# Altium integrated library OneBox.IntLib: 172 symbols (part 2 of 2) (continued)
## RK809 (continued)
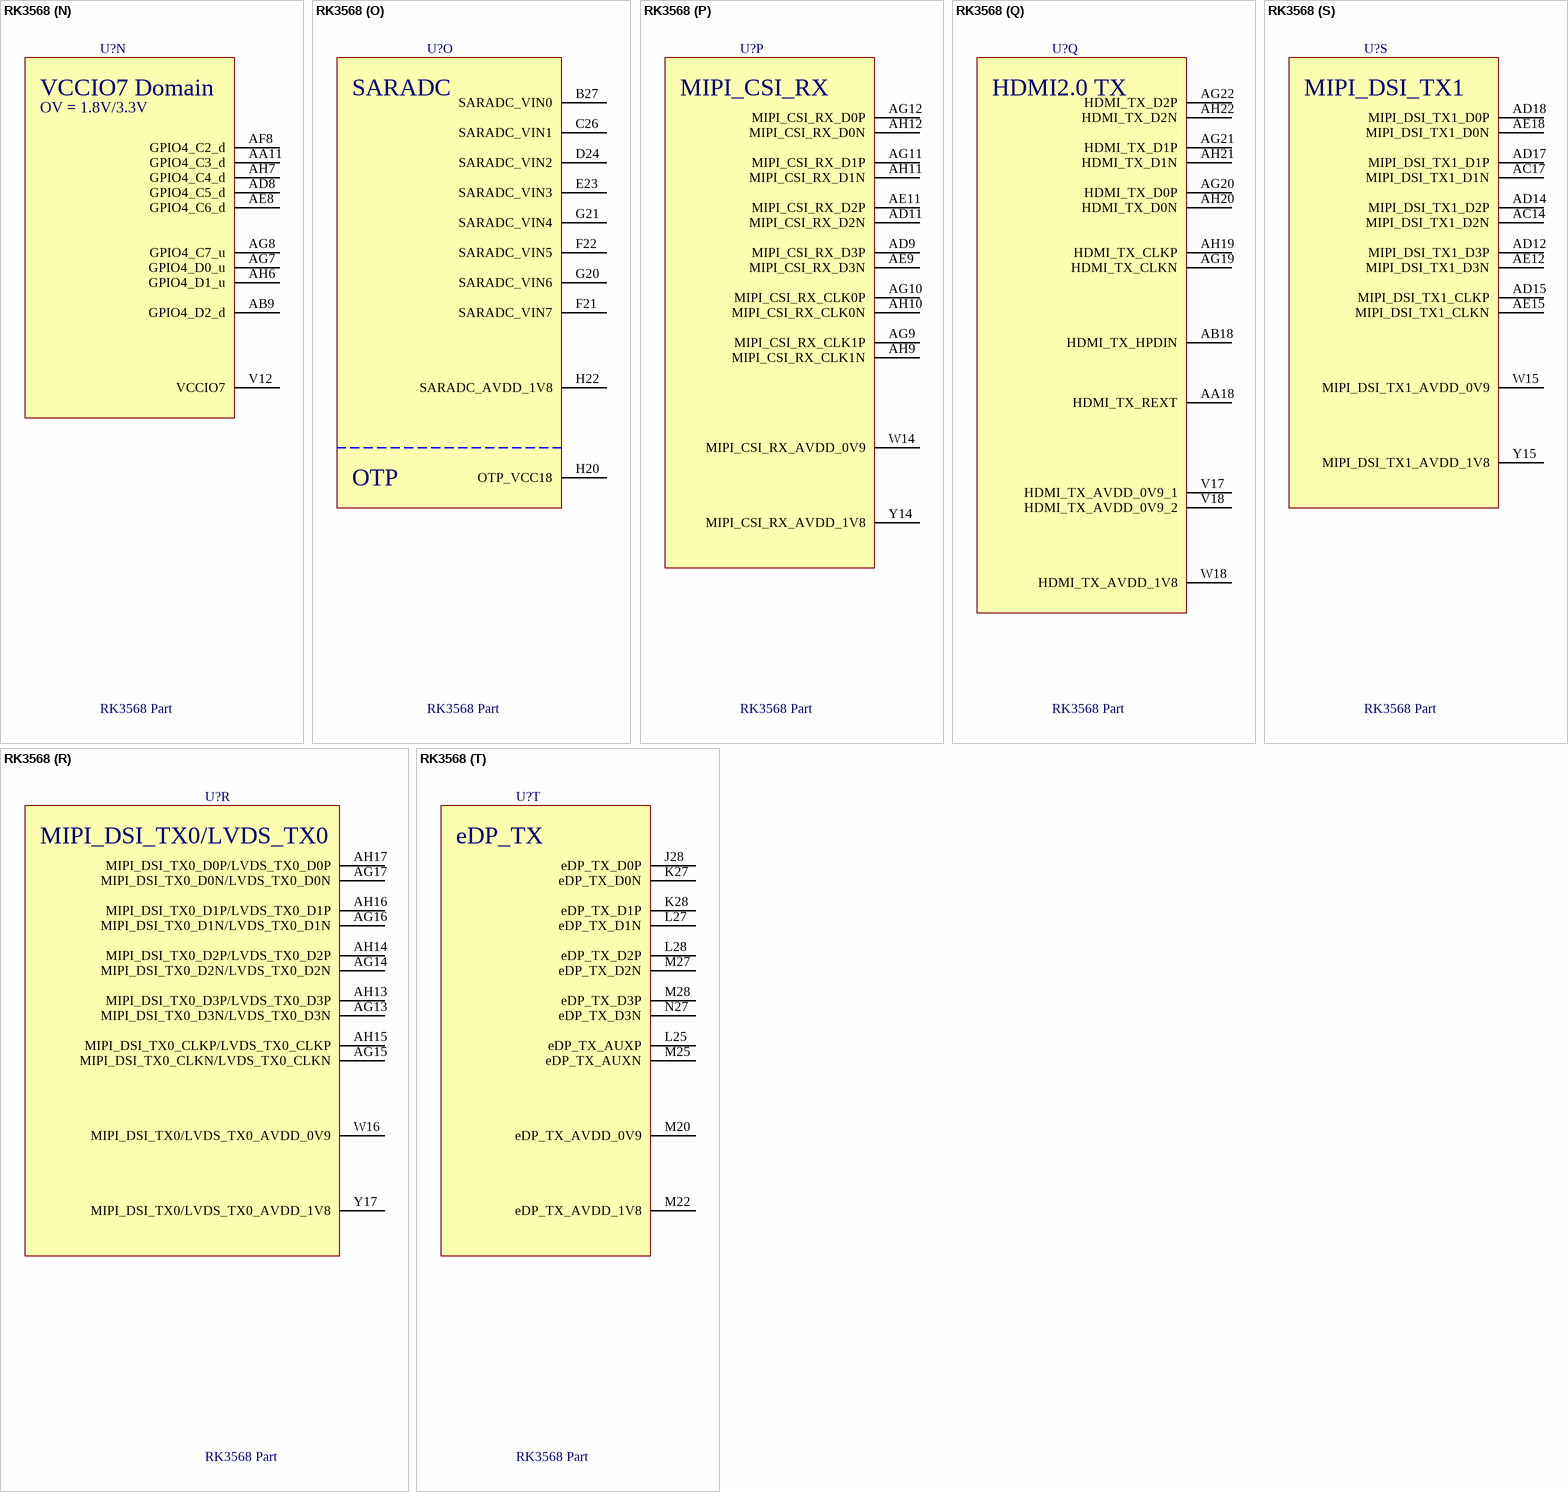
[diagram p7: symbol RK3568]
part A text: BUCK1; BUCK4; 2.5A; 1.5A; 0.5-2.4V; 0.5-3.4V; BUCK2; BUCK3; FB3=0.8V
part B text: 400mA LDO: 400mA@Vin>3V; 200mA@Vin>2V; VCC8\9:; 2.7V-5.5V; BUCK5; 1.5V-3.6V; 2.5A
part C text: Gas; Gauge; 30K
part D text: Power from; IO; Power; MIC_R; LDO4

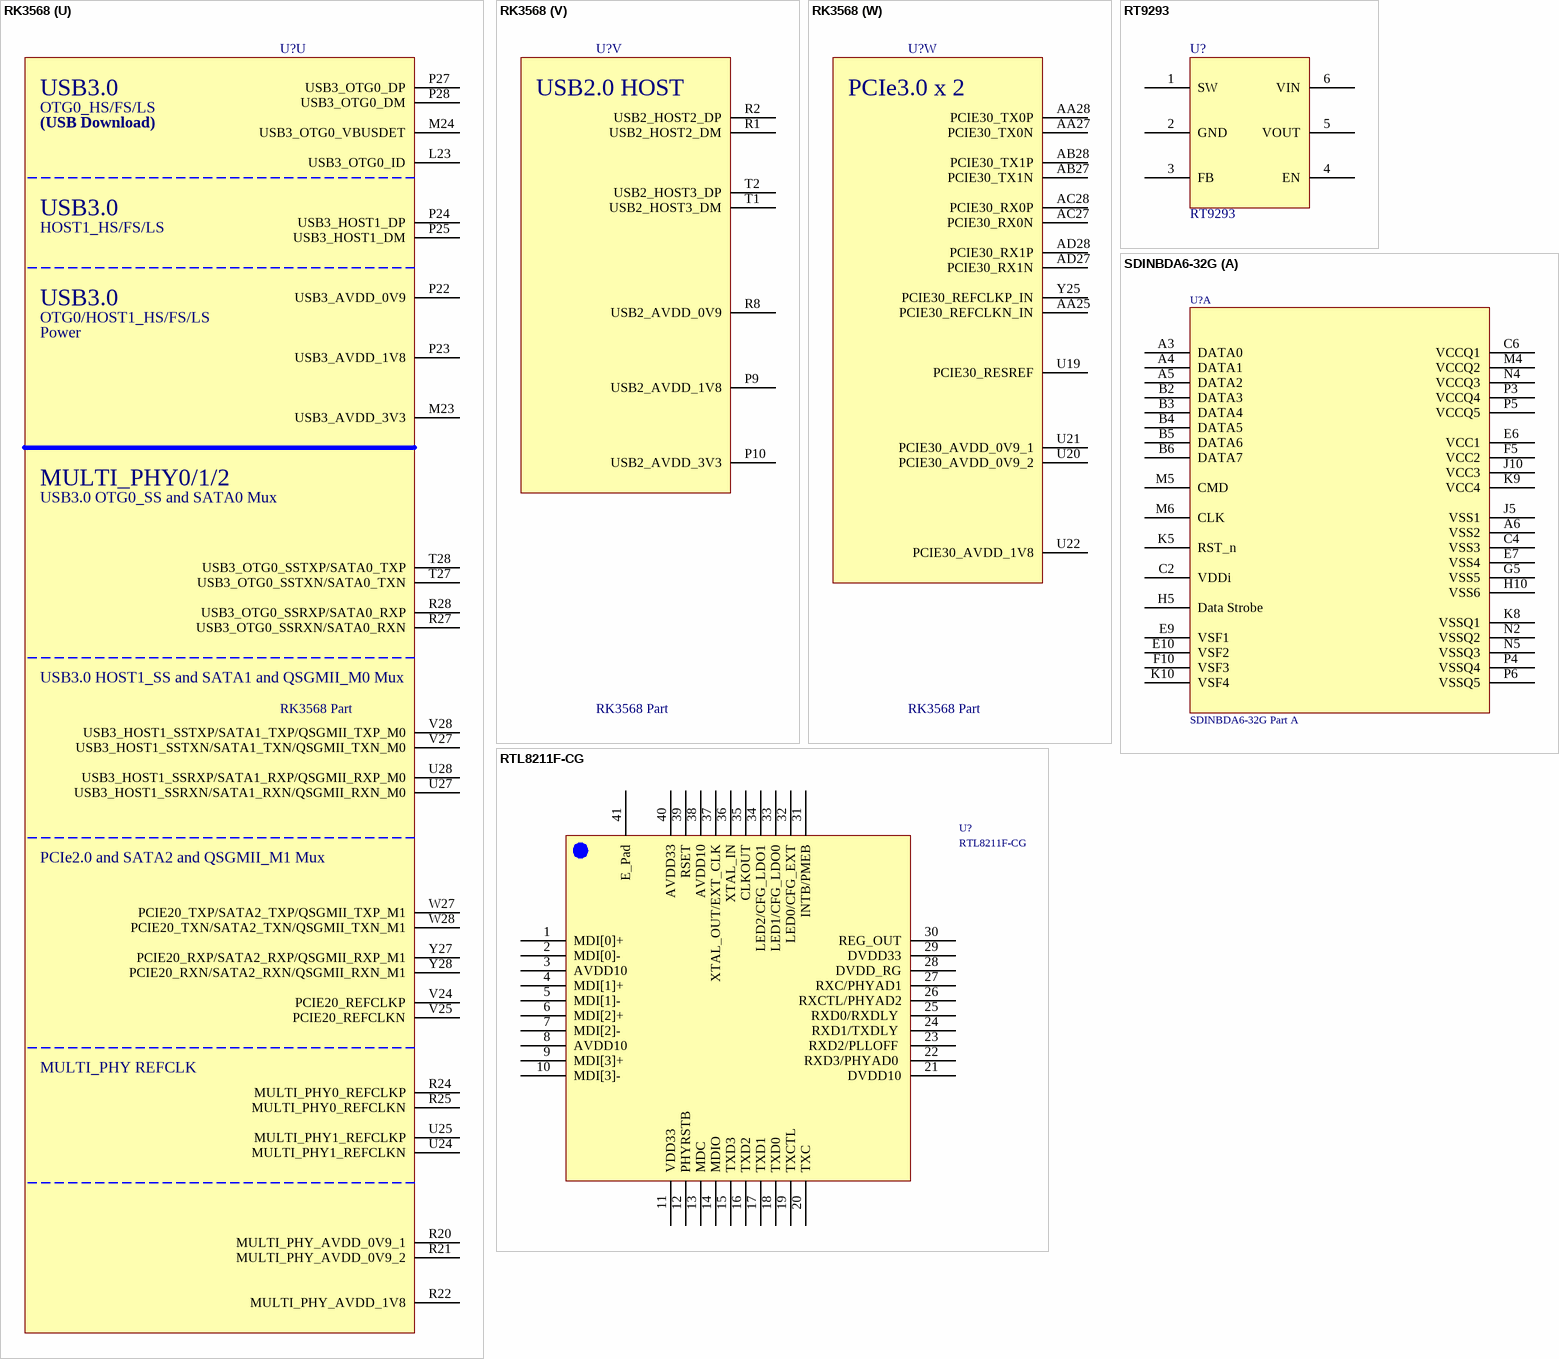
[diagram p8: symbols RK3568 to SDINBDA6-32G]

## RK3568
designator U?, comment RK3568 Part
footprint FCBGA636L
part A pins: J15 VDD_CPU_1, K15 VDD_CPU_2, K16 VDD_CPU_3, K17 VDD_CPU_4, K18 VDD_CPU_5, L12 VDD_LOGIC_1, L15 VDD_CPU_6, L16 VDD_CPU_7, L17 VDD_CPU_8, L18 VDD_CPU_9, M12 VDD_LOGIC_2, M15 VDD_CPU_COM, M17 VDD_CPU_10, M19 VDD_NPU_1, N13 VDD_LOGIC_3, N16 VDD_LOGIC_4, N19 VDD_NPU_2, P13 VDD_LOGIC_5, P16 VDD_LOGIC_6, P18 VDD_NPU_3, P19 VDD_NPU_4, P20 VDD_NPU_5, R12 VDD_LOGIC_7, R13 VDD_GPU_1, R16 VDD_LOGIC_8, T12 VDD_LOGIC_9, T13 VDD_GPU_2, T16 VDD_LOGIC_10, U11 VDD_GPU_3, U12 VDD_GPU_4, U13 VDD_GPU_5
part B pins: A1 VSS_1, A3 VSS_2, A6 VSS_3, A10 VSS_4, A14 VSS_5, A18 VSS_6, A28 VSS_7, B5 VSS_8, B9 VSS_9, B12 VSS_10, B16 VSS_11, B23 VSS_12, B26 VSS_13, C3 VSS_14, C6 VSS_15, C8 VSS_16, C9 VSS_17, C11 VSS_18, C12 VSS_19, C14 VSS_20, C15 VSS_21, C17 VSS_22, C18 VSS_23, C25 VSS_24, D2 VSS_25, D3 VSS_26, D11 VSS_27, D28 VSS_28, E3 VSS_29, E7 VSS_30, F1 VSS_31, F3 VSS_32, F9 VSS_33, F12 VSS_34, F14 VSS_35, F15 VSS_36, F17 VSS_37, G5 VSS_38, G6 VSS_39, G8 VSS_40, G9 VSS_41, G11 VSS_42, G12 VSS_43, G14 VSS_44, G15 VSS_45, G17 VSS_46, G18 VSS_47, G24 VSS_48, H2 VSS_49, H3 VSS_50, H6 VSS_51, J3 VSS_52, J5 VSS_53, J17 VSS_54, J18 VSS_55, J20 VSS_56, J22 VSS_57, J26 VSS_58, K1 VSS_59, K11 VSS_60, K12 VSS_61, K13 VSS_62, K14 VSS_63, K19 VSS_64, L3 VSS_65
part C pins: L5 VSS_66, L8 VSS_67, L11 VSS_68, L13 VSS_69, L14 VSS_70, L19 VSS_71, L20 VSS_72, L21 VSS_73, M2 VSS_74, M3 VSS_75, M6 VSS_76, M8 VSS_77, M11 VSS_78, M13 VSS_79, M14 VSS_80, M16 VSS_81, M18 VSS_82, N1 VSS_83, N12 VSS_84, N14 VSS_85, N15 VSS_86, N17 VSS_87, N18 VSS_88, P3 VSS_89, P6 VSS_90, P12 VSS_91, P14 VSS_92, P15 VSS_93, P17 VSS_94, R3 VSS_95, R6 VSS_96, R10 VSS_97, R11 VSS_98, R14 VSS_99, R15 VSS_100, R17 VSS_101, R18 VSS_102, R19 VSS_103, T10 VSS_104, T11 VSS_105, T14 VSS_106, T15 VSS_107, T17 VSS_108, T18 VSS_109, T19 VSS_110, U1 VSS_111, U6 VSS_112, U7 VSS_113, U8 VSS_114, U10 VSS_115, U14 VSS_116, U15 VSS_117, U16 VSS_118, U17 VSS_119, U18 VSS_120, V3 VSS_121, V8 VSS_122, V9 VSS_123, V13 VSS_124, W10 VSS_125, W11 VSS_126, W12 VSS_127, W13 VSS_128, Y8 VSS_129, Y9 VSS_130
part D pins: AA4 VSS_133, AA9 VSS_134, AA23 VSS_135, AB2 VSS_136, AB6 VSS_137, AD3 VSS_138, AE6 VSS_139, AE21 VSS_140, AF3 VSS_141, AF26 VSS_142, AG5 VSS_143, AH1 VSS_144, AH8 VSS_145, AH28 VSS_146, Y11 VSS_131, Y12 VSS_132
part E pins: AA12 AVSS_24, AA14 AVSS_25, AA15 AVSS_26, AA17 AVSS_27, AA24 AVSS_28, AA26 AVSS_29, AB11 AVSS_30, AB12 AVSS_31, AB14 AVSS_32, AB15 AVSS_33, AB17 AVSS_34, AC9 AVSS_35, AC11 AVSS_36, AC12 AVSS_37, AC15 AVSS_38, AC18 AVSS_39, AC25 AVSS_40, AC26 AVSS_41, AD26 AVSS_42, AE14 AVSS_43, AE17 AVSS_44, AE20 AVSS_45, AE27 AVSS_46, AE28 AVSS_47, AF9 AVSS_48, AF11 AVSS_49, AF12 AVSS_50, AF14 AVSS_51, AF15 AVSS_52, AF17 AVSS_53, AF18 AVSS_54, AF20 AVSS_55, AF21 AVSS_56, AG18 AVSS_57, AH18 AVSS_58, AH23 AVSS_59, J27 AVSS_1, L24 AVSS_2, L26 AVSS_3, M21 AVSS_4, M26 AVSS_5, N28 AVSS_6, P21 AVSS_7, P26 AVSS_8, R23 AVSS_9, R26 AVSS_10, U23 AVSS_11, U26 AVSS_12, V14 AVSS_13, V15 AVSS_14, V16 AVSS_15, V22 AVSS_16, V23 AVSS_17, V26 AVSS_18, W17 AVSS_19, Y18 AVSS_20, Y23 AVSS_21, Y24 AVSS_22, Y26 AVSS_23
part F pins: A2 AC25, A4 AC24, A5 AC9, A7 AC6, A8 AC7, A9 DDR_DQ1_B, A11 DDR_DQS0P_B, A12 DDR_DQ4_B, A13 DDR_DQ13_B, A15 DDR_DQS1N_B, A16 DDR_DQ8_B, A17 DDR_DQ10_B, B1 AC2, B2 AC26, B3 AC22, B4 AC23, B6 AC0, B7 AC5, B8 AC13, B10 DDR_DQ0_B, B11 DDR_DQS0N_B, B13 DDR_DQ12_B, B14 DDR_DQ15_B, B15 DDR_DQS1P_B, B17 DDR_DQ9_B, B18 DDR_DQ11_B, C1 AC8, C2 AC11, C4 AC12, C5 AC14, D1 DDR_DQ3_A, D5 AC16, D6 AC10, D8 AC28, D9 AC4, D12 DDR_DQ2_B, D14 DDR_DM0_B, D15 DDR_DQ5_B, D17 DDR_DQ14_B, E1 DDR_DQ1_A, E2 DDR_DQ2_A, E4 AC15, E6 AC17, E8 AC27, E9 AC19, E11 AC18, E12 DDR_DQ3_B, E14 DDR_DQ7_B, E15 DDR_DQ6_B, E17 DDR_DM1_B, F2 DDR_DQ0_A, F4 AC3, F5 AC1, F7 AC21, F8 AC20, F11 AC29, G1 DDR_DQS0P_A, G2 DDR_DQS0N_A, H1 DDR_DQ6_A, H4 DDR_DQ7_A, H5 DDR_DM0_A, H7 DDR_RZQ, H9 DDRPHY_VDDQ_1, H11 DDRPHY_VDDQ_2, H12 DDRPHY_VDDQ_3, H14 DDRPHY_VDDQ_4, H15 DDRPHY_VDDQ_5, J1 DDR_DQ4_A, J2 DDR_DQ5_A, J4 DDR_DM1_A, J6 DDR_DQ13_A, J7 DDR_DQ14_A, J8 DDR_AVSS, J9 DDRPHY_VDDQ_6, J11 DDRPHY_VDDQL_1, J12 DDRPHY_VDDQL_2, J14 DDRPHY_VDDQL_3, K2 DDR_DQ12_A, K10 DDRPHY_VDDQL_4, L1 DDR_DQS1N_A, L2 DDR_DQS1P_A, L4 DDR_DQ15_A, L6 DDR_DQ11_A, L7 DDR_DQ10_A, L9 DDRPHY_VDDQ_7, L10 DDRPHY_VDDQL_5, M1 DDR_DQ8_A, M4 DDR_ECC_DQ1, M5 DDR_ECC_DQ2, M7 DDR_ECC_DQ4, M9 DDRPHY_VDDQ_8, M10 DDRPHY_VDDQL_6, N2 DDR_DQ9_A, P1 DDR_ECC_DQS_N, P2 DDR_ECC_DQS_P, P4 DDR_ECC_DQ6, P5 DDR_ECC_DQ0, P7 DDR_ECC_DM, P8 DDR_VREFOUT, R4 DDR_ECC_DQ7, R5 DDR_ECC_DQ3, R7 DDR_ECC_DQ5
part G pins: AA20 GPIO0_B6_u, AA22 GPIO0_A3_u, AB20 GPIO0_B4_u, AB21 GPIO0_B2_u, AB23 GPIO0_D4_d, AB24 TVSS, AC20 GPIO0_D0_u, AC21 GPIO0_C5_d, AC22 GPIO0_B5_u, AC24 GPIO0_D6_d, AD20 GPIO0_C6_d, AD21 GPIO0_C4_d, AD22 GPIO0_C0_d, AD23 GPIO0_B0_u, AD25 GPIO0_D5_d, AE23 GPIO0_C3_d, AE24 GPIO0_A6_d, AE26 GPIO0_D3_d, AF23 GPIO0_C1_d, AF24 GPIO0_B1_u, AF25 GPIO0_A5_d, AF27 XOUT24M, AF28 XIN24M, AG23 GPIO0_C2_d, AG24 GPIO0_B3_u, AG25 GPIO0_A7_u, AG26 GPIO0_A1_z, AG27 GPIO0_A0_d, AG28 GPIO0_A2_d, AH24 GPIO0_D1_u, AH25 GPIO0_C7_d, AH26 GPIO0_B7_d, AH27 NPOR_u, N10 SYSPLL_AVDD_1V8, N11 SYSPLL_AVSS, P11 SYSPLL_AVDD_0V9, V19 PMU_VDD_LOGIC_0V9, V20 PMUPLL_AVSS, V21 PMUPLL_AVDD_0V9, W19 PMUIO2, Y20 PMUIO1, Y21 PMUPLL_AVDD_1V8, Y22 GPIO0_A4_u
part H pins: A19 GPIO1_A2_d, A20 GPIO1_A5_d, A21 GPIO1_B2_d, B19 GPIO1_A3_d, B20 GPIO1_A7_d, B21 GPIO1_B3_d, C20 GPIO1_A6_d, D18 GPIO1_A0_u, D20 GPIO1_B0_d, E18 GPIO1_A1_u, E20 GPIO1_B1_d, F18 GPIO1_A4_d, H17 VCCIO1
part I pins: A22 GPIO1_D0_d, A23 GPIO1_C5_d, A24 GPIO1_B4_u, A25 GPIO1_C0_u, A26 GPIO1_C6_d, A27 GPIO1_D4_u, B22 GPIO1_C4_u, B24 GPIO1_B6_u, B25 GPIO1_C3_u, C21 GPIO1_B5_u, C23 GPIO1_D3_u, C24 GPIO1_D1_u, D21 GPIO1_B7_u, D23 GPIO1_D2_u, E21 GPIO1_C1_u, E22 GPIO1_C2_u, F20 GPIO1_C7_d, H18 VCCIO2
part J pins: H26 GPIO1_D7_u, H27 GPIO2_A1_u, H28 GPIO2_A2_d, J23 GPIO2_A0_u, J24 GPIO1_D6_u, J25 GPIO1_D5_u, L22 VCCIO3
part K pins: B28 GPIO2_A5_u, C27 GPIO2_A6_u, C28 GPIO2_A7_u, D26 GPIO2_B1_d, D27 GPIO2_B0_d, E25 GPIO2_B2_u, E26 GPIO2_C6_d, E27 GPIO2_A3_u, E28 GPIO2_A4_u, F24 GPIO2_C0_d, F25 GPIO2_C2_d, F26 GPIO2_C5_d, F27 GPIO2_B6_u, F28 GPIO2_B3_u, G23 GPIO2_C1_d, G27 GPIO2_B4_u, G28 GPIO2_B5_u, H23 GPIO2_C4_d, H24 GPIO2_C3_d, H25 GPIO2_B7_d, J21 VCCIO4
part L pins: AA7 GPIO3_C2_d, AB8 GPIO3_A1_d, AC2 GPIO3_C5_d, AC3 GPIO3_C4_d, AC4 GPIO3_C3_d, AC7 GPIO2_D3_d, AC8 GPIO2_D2_d, AD1 GPIO3_C1_d, AD2 GPIO3_C0_d, AD4 GPIO3_B7_d, AD6 GPIO2_D6_d, AD7 GPIO2_D1_d, AE1 GPIO3_B4_d, AE2 GPIO3_B5_d, AE3 GPIO3_B6_d, AE5 GPIO3_A2_d, AF1 GPIO3_B3_d, AF2 GPIO3_B2_d, AF4 GPIO3_A4_d, AF5 GPIO2_D4_d, AF6 GPIO2_D5_d, AG1 GPIO3_B1_d, AG2 GPIO3_B0_d, AG3 GPIO3_A6_d, AG4 GPIO3_A3_d, AG6 GPIO2_D0_d, AH2 GPIO3_A7_d, AH3 GPIO3_A5_d, AH4 GPIO3_A0_d, AH5 GPIO2_D7_d, V10 VCCIO5_1, V11 VCCIO5_2
part M pins: AA1 GPIO3_D4_d, AA2 GPIO4_A1_d, AA3 GPIO4_A0_d, AA5 GPIO3_D5_d, AA6 GPIO3_C7_d, AB1 GPIO3_D1_d, AB5 GPIO3_D0_d, AC1 GPIO3_D3_d, AC5 GPIO3_C6_d, R9 VCCIO6_1, U2 GPIO4_C1_d, U3 GPIO4_C0_d, U4 GPIO4_B7_d, U5 GPIO4_B6_d, U9 VCCIO6_2, V1 GPIO4_B3_d, V2 GPIO4_B1_d, V4 GPIO4_B2_d, V5 GPIO4_B5_d, V6 GPIO4_B4_d, V7 GPIO4_B0_d, W1 GPIO4_A7_d, W2 GPIO4_A6_d, Y1 GPIO4_A5_d, Y2 GPIO4_A4_d, Y3 GPIO4_A3_d, Y4 GPIO4_A2_d, Y5 GPIO3_D7_d, Y6 GPIO3_D6_d, Y7 GPIO3_D2_d
part N pins: AA11 GPIO4_C3_d, AB9 GPIO4_D2_d, AD8 GPIO4_C5_d, AE8 GPIO4_C6_d, AF8 GPIO4_C2_d, AG7 GPIO4_D0_u, AG8 GPIO4_C7_u, AH6 GPIO4_D1_u, AH7 GPIO4_C4_d, V12 VCCIO7
part O pins: B27 SARADC_VIN0, C26 SARADC_VIN1, D24 SARADC_VIN2, E23 SARADC_VIN3, F21 SARADC_VIN7, F22 SARADC_VIN5, G20 SARADC_VIN6, G21 SARADC_VIN4, H20 OTP_VCC18, H22 SARADC_AVDD_1V8
part P pins: AD9 MIPI_CSI_RX_D3P, AD11 MIPI_CSI_RX_D2N, AE9 MIPI_CSI_RX_D3N, AE11 MIPI_CSI_RX_D2P, AG9 MIPI_CSI_RX_CLK1P, AG10 MIPI_CSI_RX_CLK0P, AG11 MIPI_CSI_RX_D1P, AG12 MIPI_CSI_RX_D0P, AH9 MIPI_CSI_RX_CLK1N, AH10 MIPI_CSI_RX_CLK0N, AH11 MIPI_CSI_RX_D1N, AH12 MIPI_CSI_RX_D0N, W14 MIPI_CSI_RX_AVDD_0V9, Y14 MIPI_CSI_RX_AVDD_1V8
part Q pins: AA18 HDMI_TX_REXT, AB18 HDMI_TX_HPDIN, AG19 HDMI_TX_CLKN, AG20 HDMI_TX_D0P, AG21 HDMI_TX_D1P, AG22 HDMI_TX_D2P, AH19 HDMI_TX_CLKP, AH20 HDMI_TX_D0N, AH21 HDMI_TX_D1N, AH22 HDMI_TX_D2N, V17 HDMI_TX_AVDD_0V9_1, V18 HDMI_TX_AVDD_0V9_2, W18 HDMI_TX_AVDD_1V8
part R pins: AG13 MIPI_DSI_TX0_D3N/LVDS_TX0_D3N, AG14 MIPI_DSI_TX0_D2N/LVDS_TX0_D2N, AG15 MIPI_DSI_TX0_CLKN/LVDS_TX0_CLKN, AG16 MIPI_DSI_TX0_D1N/LVDS_TX0_D1N, AG17 MIPI_DSI_TX0_D0N/LVDS_TX0_D0N, AH13 MIPI_DSI_TX0_D3P/LVDS_TX0_D3P, AH14 MIPI_DSI_TX0_D2P/LVDS_TX0_D2P, AH15 MIPI_DSI_TX0_CLKP/LVDS_TX0_CLKP, AH16 MIPI_DSI_TX0_D1P/LVDS_TX0_D1P, AH17 MIPI_DSI_TX0_D0P/LVDS_TX0_D0P, W16 MIPI_DSI_TX0/LVDS_TX0_AVDD_0V9, Y17 MIPI_DSI_TX0/LVDS_TX0_AVDD_1V8
part S pins: AC14 MIPI_DSI_TX1_D2N, AC17 MIPI_DSI_TX1_D1N, AD12 MIPI_DSI_TX1_D3P, AD14 MIPI_DSI_TX1_D2P, AD15 MIPI_DSI_TX1_CLKP, AD17 MIPI_DSI_TX1_D1P, AD18 MIPI_DSI_TX1_D0P, AE12 MIPI_DSI_TX1_D3N, AE15 MIPI_DSI_TX1_CLKN, AE18 MIPI_DSI_TX1_D0N, W15 MIPI_DSI_TX1_AVDD_0V9, Y15 MIPI_DSI_TX1_AVDD_1V8
part T pins: J28 eDP_TX_D0P, K27 eDP_TX_D0N, K28 eDP_TX_D1P, L25 eDP_TX_AUXP, L27 eDP_TX_D1N, L28 eDP_TX_D2P, M20 eDP_TX_AVDD_0V9, M22 eDP_TX_AVDD_1V8, M25 eDP_TX_AUXN, M27 eDP_TX_D2N, M28 eDP_TX_D3P, N27 eDP_TX_D3N
part U pins: L23 USB3_OTG0_ID, M23 USB3_AVDD_3V3, M24 USB3_OTG0_VBUSDET, P22 USB3_AVDD_0V9, P23 USB3_AVDD_1V8, P24 USB3_HOST1_DP, P25 USB3_HOST1_DM, P27 USB3_OTG0_DP, P28 USB3_OTG0_DM, R20 MULTI_PHY_AVDD_0V9_1, R21 MULTI_PHY_AVDD_0V9_2, R22 MULTI_PHY_AVDD_1V8, R24 MULTI_PHY0_REFCLKP, R25 MULTI_PHY0_REFCLKN, R27 USB3_OTG0_SSRXN/SATA0_RXN, R28 USB3_OTG0_SSRXP/SATA0_RXP, T27 USB3_OTG0_SSTXN/SATA0_TXN, T28 USB3_OTG0_SSTXP/SATA0_TXP, U24 MULTI_PHY1_REFCLKN, U25 MULTI_PHY1_REFCLKP, U27 USB3_HOST1_SSRXN/SATA1_RXN/QSGMII_RXN_M0, U28 USB3_HOST1_SSRXP/SATA1_RXP/QSGMII_RXP_M0, V24 PCIE20_REFCLKP, V25 PCIE20_REFCLKN, V27 USB3_HOST1_SSTXN/SATA1_TXN/QSGMII_TXN_M0, V28 USB3_HOST1_SSTXP/SATA1_TXP/QSGMII_TXP_M0, W27 PCIE20_TXP/SATA2_TXP/QSGMII_TXP_M1, W28 PCIE20_TXN/SATA2_TXN/QSGMII_TXN_M1, Y27 PCIE20_RXP/SATA2_RXP/QSGMII_RXP_M1, Y28 PCIE20_RXN/SATA2_RXN/QSGMII_RXN_M1
part V pins: P9 USB2_AVDD_1V8, P10 USB2_AVDD_3V3, R1 USB2_HOST2_DM, R2 USB2_HOST2_DP, R8 USB2_AVDD_0V9, T1 USB2_HOST3_DM, T2 USB2_HOST3_DP
part W pins: AA25 PCIE30_REFCLKN_IN, AA27 PCIE30_TX0N, AA28 PCIE30_TX0P, AB27 PCIE30_TX1N, AB28 PCIE30_TX1P, AC27 PCIE30_RX0N, AC28 PCIE30_RX0P, AD27 PCIE30_RX1N, AD28 PCIE30_RX1P, U19 PCIE30_RESREF, U20 PCIE30_AVDD_0V9_2, U21 PCIE30_AVDD_0V9_1, U22 PCIE30_AVDD_1V8, Y25 PCIE30_REFCLKP_IN
part F text: DDR PHY
part G text: OSC; PMUIO1  Domain; OV = 3.3V Only; PMUIO0  Domain; OV = 1.8V; PMU PLL; PMUIO2  Domain; OV = 1.8V/3.3V; SYS PLL; PMUIO1/2/OSC
part H text: VCCIO1 Domain; OV = 1.8V/3.3V
part I text: VCCIO2 Domain; OV = 1.8V/3.3V
part J text: VCCIO3 Domain; OV = 1.8V/3.3V
part K text: VCCIO4 Domain; OV = 1.8V/3.3V
part L text: VCCIO5 Domain; OV = 1.8V/3.3V
part M text: VCCIO6 Domain; OV = 1.8V/3.3V
part N text: VCCIO7 Domain; OV = 1.8V/3.3V
part O text: SARADC; OTP
part P text: MIPI_CSI_RX
part Q text: HDMI2.0 TX
part R text: MIPI_DSI_TX0/LVDS_TX0
part S text: MIPI_DSI_TX1
part T text: eDP_TX
part U text: USB3.0; OTG0_HS/FS/LS; (USB Download); HOST1_HS/FS/LS; OTG0/HOST1_HS/FS/LS; Power; MULTI_PHY0/1/2; USB3.0 OTG0_SS and SATA0 Mux; USB3.0 HOST1_SS and SATA1 and QSGMII_M0 Mux; PCIe2.0 and SATA2 and QSGMII_M1 Mux; MULTI_PHY REFCLK
part V text: USB2.0 HOST
part W text: PCIe3.0 x 2

## RT9293
designator U?
DC/DC升压转换芯片
footprint SOT23-6L (3x1.6x1.1mm(长宽高))
pins: 1 SW, 2 GND, 3 FB, 4 EN, 5 VOUT, 6 VIN

## RTL8211F-CG
designator U?
footprint WQFN-40
pins: 1 MDI[0]+, 2 MDI[0]-, 3 AVDD10, 4 MDI[1]+, 5 MDI[1]-, 6 MDI[2]+, 7 MDI[2]-, 8 AVDD10, 9 MDI[3]+, 10 MDI[3]-, 11 VDD33, 12 PHYRSTB, 13 MDC, 14 MDIO, 15 TXD3, 16 TXD2, 17 TXD1, 18 TXD0, 19 TXCTL, 20 TXC, 21 DVDD10, 22 RXD3/PHYAD0 , 23 RXD2/PLLOFF , 24 RXD1/TXDLY , 25 RXD0/RXDLY , 26 RXCTL/PHYAD2, 27 RXC/PHYAD1, 28 DVDD_RG, 29 DVDD33, 30 REG_OUT, 31 INTB/PMEB, 32 LED0/CFG_EXT, 33 LED1/CFG_LDO0, 34 LED2/CFG_LDO1, 35 CLKOUT, 36 XTAL_IN, 37 XTAL_OUT/EXT_CLK, 38 AVDD10, 39 RSET, 40 AVDD33, 41 E_Pad

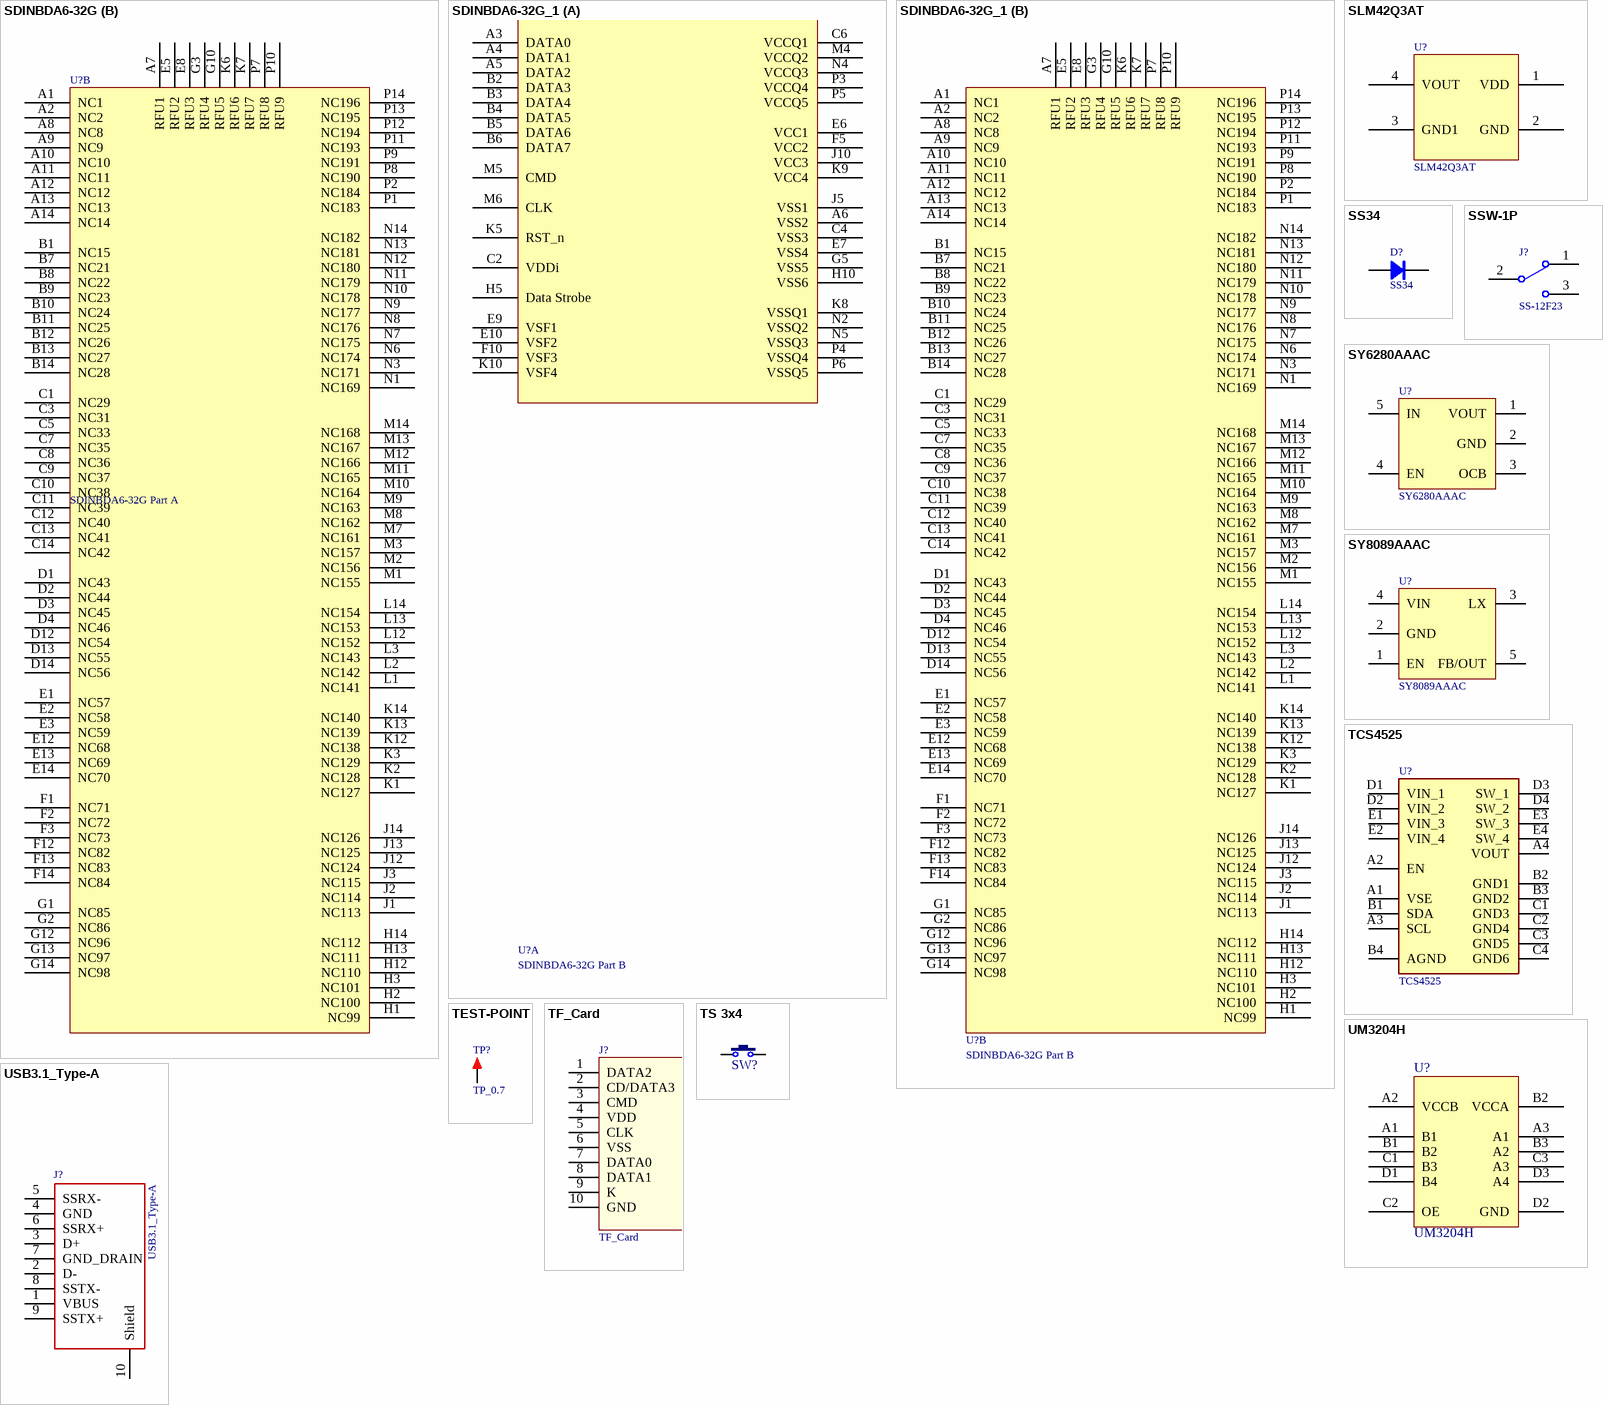
[diagram p9: symbols SDINBDA6-32G to USB3.1_Type-A]

## SDINBDA6-32G
designator U?, comment SDINBDA6-32G Part A
eMMC
footprint BGA153
part A pins: A3 DATA0, A4 DATA1, A5 DATA2, A6 VSS2, B2 DATA3, B3 DATA4, B4 DATA5, B5 DATA6, B6 DATA7, C2 VDDi, C4 VSS3, C6 VCCQ1, E6 VCC1, E7 VSS4, E9 VSF1, E10 VSF2, F5 VCC2, F10 VSF3, G5 VSS5, H5 Data Strobe, H10 VSS6, J5 VSS1, J10 VCC3, K5 RST_n, K8 VSSQ1, K9 VCC4, K10 VSF4, M4 VCCQ2, M5 CMD, M6 CLK, N2 VSSQ2, N4 VCCQ3, N5 VSSQ3, P3 VCCQ4, P4 VSSQ4, P5 VCCQ5, P6 VSSQ5
part B pins: A1 NC1, A2 NC2, A7 RFU1, A8 NC8, A9 NC9, A10 NC10, A11 NC11, A12 NC12, A13 NC13, A14 NC14, B1 NC15, B7 NC21, B8 NC22, B9 NC23, B10 NC24, B11 NC25, B12 NC26, B13 NC27, B14 NC28, C1 NC29, C3 NC31, C5 NC33, C7 NC35, C8 NC36, C9 NC37, C10 NC38, C11 NC39, C12 NC40, C13 NC41, C14 NC42, D1 NC43, D2 NC44, D3 NC45, D4 NC46, D12 NC54, D13 NC55, D14 NC56, E1 NC57, E2 NC58, E3 NC59, E5 RFU2, E8 RFU3, E12 NC68, E13 NC69, E14 NC70, F1 NC71, F2 NC72, F3 NC73, F12 NC82, F13 NC83, F14 NC84, G1 NC85, G2 NC86, G3 RFU4, G10 RFU5, G12 NC96, G13 NC97, G14 NC98, H1 NC99, H2 NC100, H3 NC101, H12 NC110, H13 NC111, H14 NC112, J1 NC113, J2 NC114, J3 NC115, J12 NC124, J13 NC125, J14 NC126, K1 NC127, K2 NC128, K3 NC129, K6 RFU6, K7 RFU7, K12 NC138, K13 NC139, K14 NC140, L1 NC141, L2 NC142, L3 NC143, L12 NC152, L13 NC153, L14 NC154, M1 NC155, M2 NC156, M3 NC157, M7 NC161, M8 NC162, M9 NC163, M10 NC164, M11 NC165, M12 NC166, M13 NC167, M14 NC168, N1 NC169, N3 NC171, N6 NC174, N7 NC175, N8 NC176, N9 NC177, N10 NC178, N11 NC179, N12 NC180, N13 NC181, N14 NC182, P1 NC183, P2 NC184, P7 RFU8, P8 NC190, P9 NC191, P10 RFU9, P11 NC193, P12 NC194, P13 NC195, P14 NC196

## SDINBDA6-32G_1
designator U?, comment SDINBDA6-32G Part B
eMMC
footprint BGA153
part A pins: A3 DATA0, A4 DATA1, A5 DATA2, A6 VSS2, B2 DATA3, B3 DATA4, B4 DATA5, B5 DATA6, B6 DATA7, C2 VDDi, C4 VSS3, C6 VCCQ1, E6 VCC1, E7 VSS4, E9 VSF1, E10 VSF2, F5 VCC2, F10 VSF3, G5 VSS5, H5 Data Strobe, H10 VSS6, J5 VSS1, J10 VCC3, K5 RST_n, K8 VSSQ1, K9 VCC4, K10 VSF4, M4 VCCQ2, M5 CMD, M6 CLK, N2 VSSQ2, N4 VCCQ3, N5 VSSQ3, P3 VCCQ4, P4 VSSQ4, P5 VCCQ5, P6 VSSQ5
part B pins: A1 NC1, A2 NC2, A7 RFU1, A8 NC8, A9 NC9, A10 NC10, A11 NC11, A12 NC12, A13 NC13, A14 NC14, B1 NC15, B7 NC21, B8 NC22, B9 NC23, B10 NC24, B11 NC25, B12 NC26, B13 NC27, B14 NC28, C1 NC29, C3 NC31, C5 NC33, C7 NC35, C8 NC36, C9 NC37, C10 NC38, C11 NC39, C12 NC40, C13 NC41, C14 NC42, D1 NC43, D2 NC44, D3 NC45, D4 NC46, D12 NC54, D13 NC55, D14 NC56, E1 NC57, E2 NC58, E3 NC59, E5 RFU2, E8 RFU3, E12 NC68, E13 NC69, E14 NC70, F1 NC71, F2 NC72, F3 NC73, F12 NC82, F13 NC83, F14 NC84, G1 NC85, G2 NC86, G3 RFU4, G10 RFU5, G12 NC96, G13 NC97, G14 NC98, H1 NC99, H2 NC100, H3 NC101, H12 NC110, H13 NC111, H14 NC112, J1 NC113, J2 NC114, J3 NC115, J12 NC124, J13 NC125, J14 NC126, K1 NC127, K2 NC128, K3 NC129, K6 RFU6, K7 RFU7, K12 NC138, K13 NC139, K14 NC140, L1 NC141, L2 NC142, L3 NC143, L12 NC152, L13 NC153, L14 NC154, M1 NC155, M2 NC156, M3 NC157, M7 NC161, M8 NC162, M9 NC163, M10 NC164, M11 NC165, M12 NC166, M13 NC167, M14 NC168, N1 NC169, N3 NC171, N6 NC174, N7 NC175, N8 NC176, N9 NC177, N10 NC178, N11 NC179, N12 NC180, N13 NC181, N14 NC182, P1 NC183, P2 NC184, P7 RFU8, P8 NC190, P9 NC191, P10 RFU9, P11 NC193, P12 NC194, P13 NC195, P14 NC196

## SLM42Q3AT
designator U?
footprint MEMS_MIC
pins: 1 VDD, 2 GND, 3 GND1, 4 VOUT

## SS34
designator D?
DO_214AC; BOM名称: 肖特基二极管; 版权归属: 源创客; 属性: 40V/3A; 学习资源: www.ooocke.com
footprint SMB (4.7*3.9*2.2mm(长宽高，不包括引脚）)
footprint SMC (7.1x5.9*2.3mm（长宽高，不包括引脚）)
pins: 1 A, 2 K

## SSW-1P
designator J?, comment SS-12F23
1路波动开关; BOM名称: 波动开关; 版权归属: 源创客; 学习资源: www.ooocke.com
footprint MSK-12C01-07 (6.7*2.8*1.5mm(长宽高）)
pins: 1, 2, 3

## SY6280AAAC
designator U?
USB电源开关/负载开关; BOM名称: 可调升压芯片; 版权归属: 源创客; 学习资源: www.ooocke.com
footprint SOT23-5M (3x1.6x1.1mm(长宽高))
footprint SOT23-5N (3x1.6x1.1mm(长宽高))
pins: 1 VOUT, 2 GND, 3 OCB, 4 EN, 5 IN

## SY8089AAAC
designator U?
DC/DC降压芯片; BOM名称: 可调升压芯片; 版权归属: 源创客; 学习资源: www.ooocke.com
footprint SOT23-5M (3x1.6x1.1mm(长宽高))
footprint SOT23-5N (3x1.6x1.1mm(长宽高))
pins: 1 EN, 2 GND, 3 LX, 4 VIN, 5 FB/OUT

## TCS4525
designator U?
Integrated Circuit; Manufacturer_Name: Texas Instruments; Manufacturer_Part_Number: TPS2124YFPR; Datasheet Link: https://www.ti.com/lit/ds/symlink/tps2124.pdf?ts=1599495749884&ref_url=https%253A%252F%252Fwww.ti.com%252Fproduct%252FTPS2124%253Fcm_session%253D61f72e71-9aa0-4c79-84ad-5cb73ebbd9d7%2526cm_type%253Dlink%2526cm_link%253D0171200c-72ac-4942-a0b9-de4d4db05476; Height: 0.5mm
footprint BGA20C40P4X5_152X192X50
pins: A1 VSE, A2 EN, A3 SCL, A4 VOUT, B1 SDA, B2 GND1, B3 GND2, B4 AGND, C1 GND3, C2 GND4, C3 GND5, C4 GND6, D1 VIN_1, D2 VIN_2, D3 SW_1, D4 SW_2, E1 VIN_3, E2 VIN_4, E3 SW_3, E4 SW_4

## TEST-POINT
designator TP?, comment TP_0.7
测试点; BOM名称: 测试点
footprint TEST 0.7 (测试点0.7mm)
footprint TEST 0.8 (测试点0.8mm)
footprint TEST 1 (测试点1mm)
footprint TEST 1.2 (测试点1.2mm)
pins: 1

## TF_Card
designator J?
TF卡座; 版权归属: 源创客; BOM名称: TF卡座; 学习资源: www.ooocke.com
footprint Micro SD
pins: 1 DATA2, 2 CD/DATA3, 3 CMD, 4 VDD, 5 CLK, 6 VSS, 7 DATA0, 8 DATA1, 9 K, 10 GND

## TS 3x4
designator SW?, comment 3x4x5  (value not drawn)
3x4轻触开关; BOM名称: 3x6轻触开关; 版权归属: 源创客; 学习资源: www.ooocke.com
footprint TS3x4x2 (防水轻触开关3x4x2)
pins: 1, 2

## UM3204H
designator U?
四通道ESD保护电平转换器
footprint CSP-12
pins: A1 B1, A2 VCCB, A3 A1, B1 B2, B2 VCCA, B3 A2, C1 B3, C2 OE, C3 A3, D1 B4, D2 GND, D3 A4

## USB3.1_Type-A
designator J?
USB3.1_Type-A贴片母座
footprint USB3.1_TYPE-A_HS (USB 3.1 Type A)
pins: 1 VBUS, 2 D-, 3 D+, 4 GND, 5 SSRX-, 6 SSRX+, 7 GND_DRAIN, 8 SSTX-, 9 SSTX+, 10 Shield

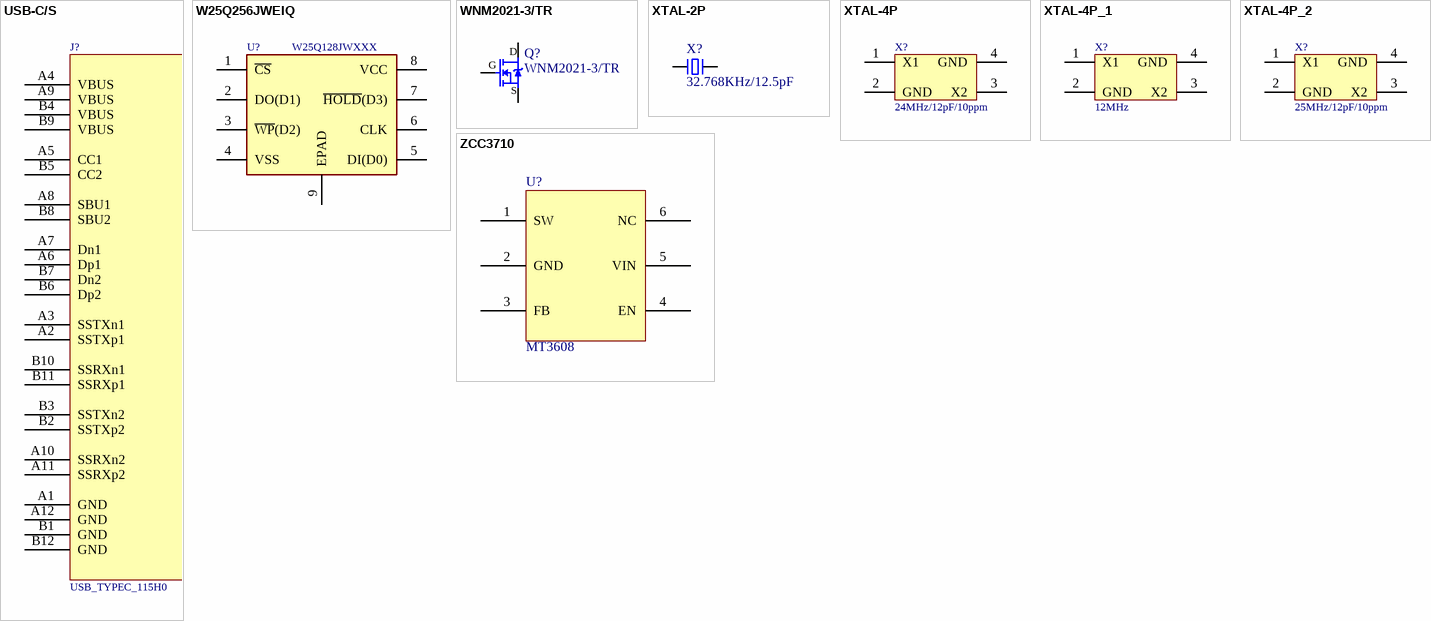
[diagram p10: symbols USB-C/S to ZCC3710]

## USB-C/S
designator J?, comment USB_TYPEC_115H0
USB-C型母接口; 版权归属: 源创客; BOM名称: USB-C型母接口; 学习资源: www.ooocke.com
footprint USB-C/S_A (Type-C 24P母座)
pins: A1 GND, A2 SSTXp1, A3 SSTXn1, A4 VBUS, A5 CC1, A6 Dp1, A7 Dn1, A8 SBU1, A9 VBUS, A10 SSRXn2, A11 SSRXp2, A12 GND, B1 GND, B2 SSTXp2, B3 SSTXn2, B4 VBUS, B5 CC2, B6 Dp2, B7 Dn2, B8 SBU2, B9 VBUS, B10 SSRXn1, B11 SSRXp1, B12 GND

## W25Q256JWEIQ
designator U?, comment W25Q128JWXXX
Integrated Circuit; Manufacturer_Name: Winbond; Manufacturer_Part_Number: W25Q256JWEIQ; Datasheet Link: https://componentsearchengine.com//W25Q256JWEIQ.pdf; Height: 0.8mm; Mouser2 Part Number: 454-W25Q256JWEIQ; Mouser2 Price/Stock: https://www.mouser.com/Search/Refine.aspx?Keyword=454-W25Q256JWEIQ
footprint SON127P800X600X80-9N-D
pins: 1 ~{CS}, 2 DO(D1), 3 ~{WP}(D2), 4 VSS, 5 DI(D0), 6 CLK, 7 ~{HOLD}(D3), 8 VCC, 9 EPAD

## WNM2021-3/TR
designator Q?
N沟道; BOM名称: 场效应管; 版权归属: 源创客; 描述: N沟道 30V/4.2A; 学习资源: www.ooocke.com
footprint SOT23-3L (3x1.3x1mm(长宽高))
footprint SOT323-3 (3x1.3x1mm(长宽高))
pins: 1 G, 2 S, 3 D

## XTAL-2P
designator X?, comment 32.768KHz/12.5pF
2脚无源脚晶振; 版权归属: 源创客; BOM名称: 2脚无源脚晶振; 学习资源: www.ooocke.com
footprint OSC 3215-2P (3.2*1.5*0.6mm(长宽高))
pins: 1, 2

## XTAL-4P
designator X?, comment 24MHz/12pF/10ppm
晶振-4脚无源晶振(谐振器）; BOM名称: 4脚无源晶振(谐振器）
footprint XTAL-3225-4P (3.2*2.5*0.7mm(长宽高))
pins: 1 X1, 2 GND, 3 X2, 4 GND

## XTAL-4P_1
designator X?, comment 12MHz
20PF; BOM名称: 4脚无源晶振(谐振器）
footprint XTAL-3225-4P (3.2*2.5*0.7mm(长宽高))
pins: 1 X1, 2 GND, 3 X2, 4 GND

## XTAL-4P_2
designator X?, comment 25MHz/12pF/10ppm
晶振-4脚无源晶振(谐振器）; BOM名称: 4脚无源晶振(谐振器）
footprint XTAL-3225-4P (3.2*2.5*0.7mm(长宽高))
pins: 1 X1, 2 GND, 3 X2, 4 GND

## ZCC3710
designator U?, comment MT3608
DC/DC升压转换芯片
footprint SOT23-6L (3x1.6x1.1mm(长宽高))
pins: 1 SW, 2 GND, 3 FB, 4 EN, 5 VIN, 6 NC